# Altium footprint library ICs And Semiconductors THD.PcbLib: 350 footprints (part 19 of 22) (continued)
## TEXAS_EBA (R-PSIP-T12) [mm] "TEXAS EBA (R-PSIP-T12) Case" (continued)
3D body "TEXAS_EBA (R-PSIP-T12).stp": height 9.65, standoff -3.26, extent -21.715,-0.215 21.715,18.02

## TEXAS_ECL (R-PDSS-T10) [mm] "Texas ECL (R-PDSS-T10)  Case"
height 8.5
pads (10):
  round 2.1 hole 1.4: 1(-7.935,6.355) 2(-7.935,1.275) 3(-7.935,-6.345) 4(4.765,-6.345) 5(7.935,-6.345) 6(7.935,-3.805) 7(7.935,-1.265) 8(7.935,1.275) 9(7.935,3.815) 10(7.935,6.355)
Top Overlay:
  lines w0.2: -9.46,-7.875 -9.46,7.875 9.46,7.875 9.46,-7.875 -9.46,-7.875
  text "1" at -6.216,5.852 h1.2
Notvisible:
  lines w0.1: -8.435,-6.345 -7.935,-6.345 ; -8.435,1.275 -7.935,1.275 ; -8.435,6.355 -7.935,6.355 ; -7.935,-6.845 -7.935,-6.345 ; -7.935,-5.845 -7.935,-6.345 ; -7.935,0.775 -7.935,1.275 ; -7.935,1.775 -7.935,1.275 ; -7.935,5.855 -7.935,6.355 ; -7.935,6.855 -7.935,6.355 ; -7.435,-6.345 -7.935,-6.345 ; -7.435,1.275 -7.935,1.275 ; -7.435,6.355 -7.935,6.355 ; -0.5,0 0,0 ; 0,-0.5 0,0 ; 0,0.5 0,0 ; 0.5,0 0,0 ; 4.265,-6.345 4.765,-6.345 ; 4.765,-6.845 4.765,-6.345 ; 4.765,-5.845 4.765,-6.345 ; 5.265,-6.345 4.765,-6.345 ; 7.435,-6.345 7.935,-6.345 ; 7.435,-3.805 7.935,-3.805 ; 7.435,-1.265 7.935,-1.265 ; 7.435,1.275 7.935,1.275 ; 7.435,3.815 7.935,3.815 ; 7.435,6.355 7.935,6.355 ; 7.935,-6.845 7.935,-6.345 ; 7.935,-5.845 7.935,-6.345 ; 7.935,-4.305 7.935,-3.805 ; 7.935,-3.305 7.935,-3.805 ; 7.935,-1.765 7.935,-1.265 ; 7.935,-0.765 7.935,-1.265 ; 7.935,0.775 7.935,1.275 ; 7.935,1.775 7.935,1.275 ; 7.935,3.315 7.935,3.815 ; 7.935,4.315 7.935,3.815 ; 7.935,5.855 7.935,6.355 ; 7.935,6.855 7.935,6.355 ; 8.435,-6.345 7.935,-6.345 ; 8.435,-3.805 7.935,-3.805 ; 8.435,-1.265 7.935,-1.265 ; 8.435,1.275 7.935,1.275 ; 8.435,3.815 7.935,3.815 ; 8.435,6.355 7.935,6.355
Mechanical 14:
  lines w0.1: -9.46,-7.875 -9.46,7.875 9.46,7.875 9.46,-7.875 -9.46,-7.875 ; -4.963,-3.774 -1.963,-3.774 -1.963,-0.774 -4.963,-0.774 -4.963,-3.774 ; -4.963,0.422 -1.963,0.422 -1.963,3.422 -4.963,3.422 -4.963,0.422 ; -4.963,4.361 -1.963,4.361 -1.963,7.361 -4.963,7.361 -4.963,4.361 ; -0.75,2.683 0.75,2.683 0.75,4.683 -0.75,4.683 -0.75,2.683 ; -0.75,5.572 0.75,5.572 0.75,7.072 -0.75,7.072 -0.75,5.572 ; 1.656,-4.966 cw(c3.314,-2.466) 1.656,0.034 4.972,0.034 cw(c3.314,-2.466) 4.972,-4.966 1.656,-4.966 ; 4.255,4.516 5.755,4.516 5.755,6.016 4.255,6.016 4.255,4.516
  text "1" at -6.216,5.852 h1.2
Mechanical 15:
  lines w0.05: -9.97,-8.38 -9.97,8.38 9.97,8.38 9.97,-8.38 -9.97,-8.38
3D body "TEXAS_ECL (R-PDSS-T10).stp": height 8.5, standoff -3.55, extent -9.46,-7.875 9.46,7.875

## TEXAS_EGP (R-PDSS-T12) [mm] "Texas EGP (R-PDSS-T12) Case"
height 9.65
pads (12):
  round 2.1 hole 1.4: 1(-11.11,7.94) 2(-11.11,-7.94) 3(-1.59,-7.94) 4(11.11,-7.94)
  round 1.1 hole 0.7: 5(11.11,-0.95) 6(11.11,0.32) 7(11.11,1.59) 8(11.11,2.86) 9(11.11,4.13) 10(11.11,5.4) 11(11.11,6.67) 11(11.11,7.94)
Top Overlay:
  lines w0.2: -12.635,-9.46 12.635,-9.46 12.635,9.46 -12.635,9.46 -12.635,-9.46
  text "1" at -9.391,7.392 h1.2
Notvisible:
  lines w0.1: -12.11,-7.94 -11.11,-7.94 ; -12.11,7.94 -11.11,7.94 ; -11.11,-8.94 -11.11,-7.94 ; -11.11,-6.94 -11.11,-7.94 ; -11.11,6.94 -11.11,7.94 ; -11.11,8.94 -11.11,7.94 ; -10.11,-7.94 -11.11,-7.94 ; -10.11,7.94 -11.11,7.94 ; -2.59,-7.94 -1.59,-7.94 ; -1.59,-8.94 -1.59,-7.94 ; -1.59,-6.94 -1.59,-7.94 ; -1,0 0,0 ; -0.59,-7.94 -1.59,-7.94 ; 0,-1 0,0 ; 0,1 0,0 ; 1,0 0,0 ; 10.11,-7.94 11.11,-7.94 ; 10.11,-0.95 11.11,-0.95 ; 10.11,0.32 11.11,0.32 12.11,0.32 ; 10.11,1.59 11.11,1.59 12.11,1.59 ; 10.11,2.86 11.11,2.86 12.11,2.86 ; 10.11,4.13 11.11,4.13 12.11,4.13 ; 10.11,5.4 11.11,5.4 12.11,5.4 ; 10.11,6.67 11.11,6.67 12.11,6.67 ; 10.11,7.94 11.11,7.94 ; 11.11,-8.94 11.11,-7.94 ; 11.11,-6.94 11.11,-7.94 ; 12.11,-7.94 11.11,-7.94 ; 12.11,-0.95 11.11,-0.95 ; 12.11,7.94 11.11,7.94 ; 11.11,-0.95 11.11,7.94
Mechanical 14:
  lines w0.1: -11.987,-3.37 -9.287,-3.37 ; -11.987,-0.97 -9.287,-0.97 ; -11.987,1.648 -9.287,1.648 ; -11.987,4.048 -9.287,4.048 ; 1.053,-8.309 1.053,-5.609 ; 3.453,-8.309 3.453,-5.609 ; 5.957,-8.309 5.957,-5.609 ; 8.357,-8.309 8.357,-5.609 ; -12.635,-9.46 12.635,-9.46 12.635,9.46 -12.635,9.46 -12.635,-9.46 ; -11.987,-3.87 -9.287,-3.87 -9.287,-0.47 -11.987,-0.47 -11.987,-3.87 ; -11.987,1.148 -9.287,1.148 -9.287,4.548 -11.987,4.548 -11.987,1.148 ; -8.076,-6.046 -3.076,-6.046 -3.076,-2.046 -8.076,-2.046 -8.076,-6.046 ; -8.076,2.804 -3.076,2.804 -3.076,6.804 -8.076,6.804 -8.076,2.804 ; -1.431,-4.339 -1.431,7.661 8.569,7.661 8.569,-4.339 -1.431,-4.339 ; 0.553,-8.309 3.953,-8.309 3.953,-5.609 0.553,-5.609 0.553,-8.309 ; 5.457,-8.309 8.857,-8.309 8.857,-5.609 5.457,-5.609 5.457,-8.309
  text "1" at -9.391,7.392 h1.2
Mechanical 15:
  lines w0.1: -13.145,-9.97 -13.145,9.97 13.145,9.97 13.145,-9.97 -13.145,-9.97
3D body "TEXAS_EGP (R-PDSS-T12).stp": height 9.65, standoff -3.55, extent -12.635,-9.46 12.635,9.46

## TEXAS_ELA (R-MSIP-T23) [mm] "TEXAS (R-MSIP-T23) Case"
height 12.7
pads (27):
  round 1.7 hole 1.2: 1(27.94,-10.665) 2(25.4,-10.665) 3(22.86,-10.665) 4(20.32,-10.665) 5(17.78,-10.665) 6(15.24,-10.665) 7(12.7,-10.665) 8(10.16,-10.665) 9(7.62,-10.665) 10(5.08,-10.665) 11(2.54,-10.665) 12(0,-10.665) 13(-2.54,-10.665) 14(-5.08,-10.665) 15(-7.62,-10.665) 16(-10.16,-10.665) 17(-12.7,-10.665) 18(-15.24,-10.665) 19(-17.78,-10.665) 20(-20.32,-10.665) 21(-22.86,-10.665) 22(-25.4,-10.665) 23(-27.94,-10.665)
  round 2.3 hole 1.8: 24(-32.105,-10.665) 25(-32.105,10.665) 26(32.105,10.665) 27(32.105,-10.665)
Top Overlay:
  lines w0.2: -32.605,-12.079 -32.605,-19.055 -31.605,-19.055 -31.605,-14.735 31.605,-14.735 31.605,-19.055 32.605,-19.055 32.605,-12.079 ; -32.605,-9.251 -32.605,9.251 ; -30.691,11.165 30.691,11.165 ; 32.605,-9.251 32.605,9.251
  text "1" at 27.684,-9.323 h1.2
Notvisible:
  lines w0.1: -33.105,-10.665 -32.105,-10.665 ; -33.105,10.665 -32.105,10.665 ; -32.105,-11.665 -32.105,-10.665 ; -32.105,-9.665 -32.105,-10.665 ; -32.105,9.665 -32.105,10.665 ; -32.105,11.665 -32.105,10.665 ; -31.105,-10.665 -32.105,-10.665 ; -31.105,10.665 -32.105,10.665 ; -28.94,-10.665 -27.94,-10.665 ; -27.94,-11.665 -27.94,-10.665 ; -27.94,-9.665 -27.94,-10.665 ; -26.94,-10.665 -27.94,-10.665 ; -26.4,-10.665 -25.4,-10.665 ; -25.4,-11.665 -25.4,-10.665 ; -25.4,-9.665 -25.4,-10.665 ; -24.4,-10.665 -25.4,-10.665 ; -23.86,-10.665 -22.86,-10.665 ; -22.86,-11.665 -22.86,-10.665 ; -22.86,-9.665 -22.86,-10.665 ; -21.86,-10.665 -22.86,-10.665 ; -21.32,-10.665 -20.32,-10.665 ; -20.32,-11.665 -20.32,-10.665 ; -20.32,-9.665 -20.32,-10.665 ; -19.32,-10.665 -20.32,-10.665 ; -18.78,-10.665 -17.78,-10.665 ; -17.78,-11.665 -17.78,-10.665 ; -17.78,-9.665 -17.78,-10.665 ; -16.78,-10.665 -17.78,-10.665 ; -16.24,-10.665 -15.24,-10.665 ; -15.24,-11.665 -15.24,-10.665 ; -15.24,-9.665 -15.24,-10.665 ; -14.24,-10.665 -15.24,-10.665 ; -13.7,-10.665 -12.7,-10.665 ; -12.7,-11.665 -12.7,-10.665 ; -12.7,-9.665 -12.7,-10.665 ; -11.7,-10.665 -12.7,-10.665 ; -11.16,-10.665 -10.16,-10.665 ; -10.16,-11.665 -10.16,-10.665 ; -10.16,-9.665 -10.16,-10.665 ; -9.16,-10.665 -10.16,-10.665 ; -8.62,-10.665 -7.62,-10.665 ; -7.62,-11.665 -7.62,-10.665 ; -7.62,-9.665 -7.62,-10.665 ; -6.62,-10.665 -7.62,-10.665 ; -6.08,-10.665 -5.08,-10.665 ; -5.08,-11.665 -5.08,-10.665 ; -5.08,-9.665 -5.08,-10.665 ; -4.08,-10.665 -5.08,-10.665 ; -3.54,-10.665 -2.54,-10.665 ; -2.54,-11.665 -2.54,-10.665 ; -2.54,-9.665 -2.54,-10.665 ; -1.54,-10.665 -2.54,-10.665 ; -1,-10.665 0,-10.665 ; -1,0 0,0 ; 0,-11.665 0,-10.665 ; 0,-9.665 0,-10.665 ; 0,-1 0,0 ; 0,1 0,0 ; 1,-10.665 0,-10.665 ; 1,0 0,0 ; 1.54,-10.665 2.54,-10.665 ; 2.54,-11.665 2.54,-10.665 ; 2.54,-9.665 2.54,-10.665 ; 3.54,-10.665 2.54,-10.665 ; 4.08,-10.665 5.08,-10.665 ; 5.08,-11.665 5.08,-10.665 ; 5.08,-9.665 5.08,-10.665 ; 6.08,-10.665 5.08,-10.665 ; 6.62,-10.665 7.62,-10.665 ; 7.62,-11.665 7.62,-10.665 ; 7.62,-9.665 7.62,-10.665 ; 8.62,-10.665 7.62,-10.665 ; 9.16,-10.665 10.16,-10.665 ; 10.16,-11.665 10.16,-10.665 ; 10.16,-9.665 10.16,-10.665 ; 11.16,-10.665 10.16,-10.665 ; 11.7,-10.665 12.7,-10.665 ; 12.7,-11.665 12.7,-10.665 ; 12.7,-9.665 12.7,-10.665 ; 13.7,-10.665 12.7,-10.665 ; 14.24,-10.665 15.24,-10.665 ; 15.24,-11.665 15.24,-10.665 ; 15.24,-9.665 15.24,-10.665 ; 16.24,-10.665 15.24,-10.665 ; 16.78,-10.665 17.78,-10.665 ; 17.78,-11.665 17.78,-10.665 ; 17.78,-9.665 17.78,-10.665 ; 18.78,-10.665 17.78,-10.665 ; 19.32,-10.665 20.32,-10.665 ; 20.32,-11.665 20.32,-10.665 ; 20.32,-9.665 20.32,-10.665 ; 21.32,-10.665 20.32,-10.665 ; 21.86,-10.665 22.86,-10.665 ; 22.86,-11.665 22.86,-10.665 ; 22.86,-9.665 22.86,-10.665 ; 23.86,-10.665 22.86,-10.665 ; 24.4,-10.665 25.4,-10.665 ; 25.4,-11.665 25.4,-10.665 ; 25.4,-9.665 25.4,-10.665 ; 26.4,-10.665 25.4,-10.665 ; 26.94,-10.665 27.94,-10.665 ; 27.94,-11.665 27.94,-10.665 ; 27.94,-9.665 27.94,-10.665 ; 28.94,-10.665 27.94,-10.665 ; 31.105,-10.665 32.105,-10.665 ; 31.105,10.665 32.105,10.665 ; 32.105,-11.665 32.105,-10.665 ; 32.105,-9.665 32.105,-10.665 ; 32.105,9.665 32.105,10.665 ; 32.105,11.665 32.105,10.665 ; 33.105,-10.665 32.105,-10.665 ; 33.105,10.665 32.105,10.665
Mechanical 14:
  lines w0.1: -29.105,-14.735 -29.105,-12.235 29.105,-12.235 29.105,-14.735 ; -28.44,-14.735 -31.605,-14.735 -31.605,-19.055 -32.605,-19.055 -32.605,11.165 32.605,11.165 32.605,-19.055 31.605,-19.055 31.605,-14.735 28.44,-14.735 ; -27.44,-14.735 -25.9,-14.735 ; -24.9,-14.735 -23.36,-14.735 ; -22.36,-14.735 -20.82,-14.735 ; -19.82,-14.735 -18.28,-14.735 ; -17.28,-14.735 -15.74,-14.735 ; -14.74,-14.735 -13.2,-14.735 ; -12.2,-14.735 -10.66,-14.735 ; -9.66,-14.735 -8.12,-14.735 ; -7.12,-14.735 -5.58,-14.735 ; -4.58,-14.735 -3.04,-14.735 ; -2.04,-14.735 -0.5,-14.735 ; 0.5,-14.735 2.04,-14.735 ; 3.04,-14.735 4.58,-14.735 ; 5.58,-14.735 7.12,-14.735 ; 8.12,-14.735 9.66,-14.735 ; 10.66,-14.735 12.2,-14.735 ; 13.2,-14.735 14.74,-14.735 ; 15.74,-14.735 17.28,-14.735 ; 18.28,-14.735 19.82,-14.735 ; 20.82,-14.735 22.36,-14.735 ; 23.36,-14.735 24.9,-14.735 ; 25.9,-14.735 27.44,-14.735 ; -28.44,-15.535 -27.44,-15.535 -27.44,-13.331 -28.44,-13.331 -28.44,-15.535 ; -25.9,-15.535 -24.9,-15.535 -24.9,-13.331 -25.9,-13.331 -25.9,-15.535 ; -23.36,-15.535 -22.36,-15.535 -22.36,-13.331 -23.36,-13.331 -23.36,-15.535 ; -20.82,-15.535 -19.82,-15.535 -19.82,-13.331 -20.82,-13.331 -20.82,-15.535 ; -18.28,-15.535 -17.28,-15.535 -17.28,-13.331 -18.28,-13.331 -18.28,-15.535 ; -15.74,-15.535 -14.74,-15.535 -14.74,-13.331 -15.74,-13.331 -15.74,-15.535 ; -13.2,-15.535 -12.2,-15.535 -12.2,-13.331 -13.2,-13.331 -13.2,-15.535 ; -10.66,-15.535 -9.66,-15.535 -9.66,-13.331 -10.66,-13.331 -10.66,-15.535 ; -8.12,-15.535 -7.12,-15.535 -7.12,-13.331 -8.12,-13.331 -8.12,-15.535 ; -5.58,-15.535 -4.58,-15.535 -4.58,-13.331 -5.58,-13.331 -5.58,-15.535 ; -3.04,-15.535 -2.04,-15.535 -2.04,-13.331 -3.04,-13.331 -3.04,-15.535 ; -0.5,-15.535 0.5,-15.535 0.5,-13.331 -0.5,-13.331 -0.5,-15.535 ; 2.04,-15.535 3.04,-15.535 3.04,-13.331 2.04,-13.331 2.04,-15.535 ; 4.58,-15.535 5.58,-15.535 5.58,-13.331 4.58,-13.331 4.58,-15.535 ; 7.12,-15.535 8.12,-15.535 8.12,-13.331 7.12,-13.331 7.12,-15.535 ; 9.66,-15.535 10.66,-15.535 10.66,-13.331 9.66,-13.331 9.66,-15.535 ; 12.2,-15.535 13.2,-15.535 13.2,-13.331 12.2,-13.331 12.2,-15.535 ; 14.74,-15.535 15.74,-15.535 15.74,-13.331 14.74,-13.331 14.74,-15.535 ; 17.28,-15.535 18.28,-15.535 18.28,-13.331 17.28,-13.331 17.28,-15.535 ; 19.82,-15.535 20.82,-15.535 20.82,-13.331 19.82,-13.331 19.82,-15.535 ; 22.36,-15.535 23.36,-15.535 23.36,-13.331 22.36,-13.331 22.36,-15.535 ; 24.9,-15.535 25.9,-15.535 25.9,-13.331 24.9,-13.331 24.9,-15.535 ; 27.44,-15.535 28.44,-15.535 28.44,-13.331 27.44,-13.331 27.44,-15.535
  text "1" at 27.684,-9.323 h1.2
3D body "TEXAS_ELA (R-MSIP-T23).stp": height 12.7, standoff -4, extent -32.605,-19.055 32.605,11.165

## TEXAS_ERW (R-PDSS-T11) [mm] "Texas ERW (R-PDSS-T11) Case, Body W 51.94 x L 26.54 x H9.98mm"
height 8.98
pads (11):
  round 2 hole 1.3: 1(-24.445,9.51) 2(-24.445,3.16) 3(-24.445,-3.19) 4(-24.445,-9.54) 5(24.445,-9.54) 6(24.445,-6.365) 7(24.445,-3.19) 8(24.445,-0.015) 9(24.445,3.16) 10(24.445,6.335) 11(24.445,9.51)
Top Overlay:
  circle w0.2: c-24.37,12.085 r0.5
  circle w0.2: c11.97,0.23 r3.35
  circle w0.2: c11.97,0.23 r3.85
  lines w0.2: -22.16,8.861 -22.16,7.67 -21.68,7.67 -21.68,8.87 ; -21.22,11.35 -21.22,11.92 -19.62,11.92 -19.62,11.353 ; -20.66,8.861 -20.66,7.67 -20.18,7.67 -20.18,8.861 ; -19.16,8.87 -19.16,7.67 -18.68,7.67 -18.68,8.87 ; -10.03,-9.57 -14.23,-9.57 -14.23,2.03 -10.03,2.03 ; -0.03,-9.57 4.17,-9.57 4.17,2.03 -0.03,2.03 ; 5.47,6.38 2.564,6.38 2.564,7.27 5.47,7.27 ; 5.47,8.66 4.47,8.66 4.47,9.55 5.47,9.55 ; 5.47,10.94 2.564,10.94 2.564,11.83 5.47,11.83 ; 7.57,-11.83 4.664,-11.83 4.664,-10.94 7.57,-10.94 ; 7.57,-9.55 6.57,-9.55 6.57,-8.66 7.57,-8.66 ; 7.57,-7.27 4.664,-7.27 4.664,-6.38 7.57,-6.38 ; 11.69,6.375 12.46,6.375 12.96,7.175 12.96,11.035 12.46,11.835 11.69,11.835 ; 13.79,-11.835 14.56,-11.835 15.06,-11.035 15.06,-7.175 14.56,-6.375 13.79,-6.375 ; 18.299,-3.559 20.999,-3.559 ; 18.299,-1.159 20.999,-1.159 ; -26.35,-13.65 26.35,-13.65 26.35,13.65 -26.35,13.65 -26.35,-13.65 ; -22.67,-9.77 -17.67,-9.77 -17.67,-3.37 -22.67,-3.37 -22.67,-9.77 ; -22.67,8.87 -18.17,8.87 -18.17,11.35 -22.67,11.35 -22.67,8.87 ; -13.17,6.07 -8.97,6.07 -8.97,9.07 -13.17,9.07 -13.17,6.07 ; -10.03,-11.27 -10.03,3.73 -0.03,3.73 -0.03,-11.27 -10.03,-11.27 ; 5.47,5.74 11.69,5.74 11.69,12.47 5.47,12.47 5.47,5.74 ; 6.72,-3.07 8.52,-4.87 15.42,-4.87 17.22,-3.07 17.22,3.53 ccw(c15.42,3.53) 15.42,5.33 8.52,5.33 6.72,3.53 6.72,-3.07 ; 7.57,-12.47 13.79,-12.47 13.79,-5.74 7.57,-5.74 7.57,-12.47 ; 18.299,-4.059 18.299,-0.659 20.999,-0.659 20.999,-4.059 18.299,-4.059
Notvisible:
  lines w0.1: -24.945,-9.54 -24.445,-9.54 ; -24.945,-3.19 -24.445,-3.19 ; -24.945,3.16 -24.445,3.16 ; -24.945,9.51 -24.445,9.51 ; -24.445,-10.04 -24.445,-9.54 ; -24.445,-9.04 -24.445,-9.54 ; -24.445,-3.69 -24.445,-3.19 ; -24.445,-2.69 -24.445,-3.19 ; -24.445,2.66 -24.445,3.16 ; -24.445,3.66 -24.445,3.16 ; -24.445,9.01 -24.445,9.51 ; -24.445,10.01 -24.445,9.51 ; -23.945,-9.54 -24.445,-9.54 ; -23.945,-3.19 -24.445,-3.19 ; -23.945,3.16 -24.445,3.16 ; -23.945,9.51 -24.445,9.51 ; -0.354,-0.354 0,0 ; -0.354,0.354 0,0 ; 0.354,-0.354 0,0 ; 0.354,0.354 0,0 ; 23.945,-9.54 24.445,-9.54 ; 23.945,-6.365 24.445,-6.365 ; 23.945,-3.19 24.445,-3.19 ; 23.945,-0.015 24.445,-0.015 ; 23.945,3.16 24.445,3.16 ; 23.945,6.335 24.445,6.335 ; 23.945,9.51 24.445,9.51 ; 24.445,-10.04 24.445,-9.54 ; 24.445,-9.04 24.445,-9.54 ; 24.445,-6.865 24.445,-6.365 ; 24.445,-5.865 24.445,-6.365 ; 24.445,-3.69 24.445,-3.19 ; 24.445,-2.69 24.445,-3.19 ; 24.445,-0.515 24.445,-0.015 ; 24.445,0.485 24.445,-0.015 ; 24.445,2.66 24.445,3.16 ; 24.445,3.66 24.445,3.16 ; 24.445,5.835 24.445,6.335 ; 24.445,6.835 24.445,6.335 ; 24.445,9.01 24.445,9.51 ; 24.445,10.01 24.445,9.51 ; 24.945,-9.54 24.445,-9.54 ; 24.945,-6.365 24.445,-6.365 ; 24.945,-3.19 24.445,-3.19 ; 24.945,-0.015 24.445,-0.015 ; 24.945,3.16 24.445,3.16 ; 24.945,6.335 24.445,6.335 ; 24.945,9.51 24.445,9.51
Mechanical 14:
  circle w0.1: c-24.37,12.085 r0.5
  circle w0.1: c11.97,0.23 r3.35
  circle w0.1: c11.97,0.23 r3.85
  circle w0.1: c-24.445,9.51 r0.85
  circle w0.1: c-24.445,3.16 r0.85
  circle w0.1: c-24.445,-3.19 r0.85
  circle w0.1: c-24.445,-9.54 r0.85
  circle w0.1: c24.445,-9.54 r0.85
  circle w0.1: c24.445,-6.365 r0.85
  circle w0.1: c24.445,-3.19 r0.85
  circle w0.1: c24.445,-0.015 r0.85
  circle w0.1: c24.445,3.16 r0.85
  circle w0.1: c24.445,6.335 r0.85
  circle w0.1: c24.445,9.51 r0.85
  lines w0.1: -22.16,8.861 -22.16,7.67 -21.68,7.67 -21.68,8.87 ; -21.22,11.35 -21.22,11.92 -19.62,11.92 -19.62,11.353 ; -20.66,8.861 -20.66,7.67 -20.18,7.67 -20.18,8.861 ; -19.16,8.87 -19.16,7.67 -18.68,7.67 -18.68,8.87 ; -10.03,-9.57 -14.23,-9.57 -14.23,2.03 -10.03,2.03 ; -0.03,-9.57 4.17,-9.57 4.17,2.03 -0.03,2.03 ; 5.47,6.38 2.564,6.38 2.564,7.27 5.47,7.27 ; 5.47,8.66 4.47,8.66 4.47,9.55 5.47,9.55 ; 5.47,10.94 2.564,10.94 2.564,11.83 5.47,11.83 ; 7.57,-11.83 4.664,-11.83 4.664,-10.94 7.57,-10.94 ; 7.57,-9.55 6.57,-9.55 6.57,-8.66 7.57,-8.66 ; 7.57,-7.27 4.664,-7.27 4.664,-6.38 7.57,-6.38 ; 11.69,6.375 12.46,6.375 12.96,7.175 12.96,11.035 12.46,11.835 11.69,11.835 ; 13.79,-11.835 14.56,-11.835 15.06,-11.035 15.06,-7.175 14.56,-6.375 13.79,-6.375 ; 18.299,-3.559 20.999,-3.559 ; 18.299,-1.159 20.999,-1.159 ; -26.35,-13.65 26.35,-13.65 26.35,13.65 -26.35,13.65 -26.35,-13.65 ; -22.67,-9.77 -17.67,-9.77 -17.67,-3.37 -22.67,-3.37 -22.67,-9.77 ; -22.67,8.87 -18.17,8.87 -18.17,11.35 -22.67,11.35 -22.67,8.87 ; -13.17,6.07 -8.97,6.07 -8.97,9.07 -13.17,9.07 -13.17,6.07 ; -10.03,-11.27 -10.03,3.73 -0.03,3.73 -0.03,-11.27 -10.03,-11.27 ; 5.47,5.74 11.69,5.74 11.69,12.47 5.47,12.47 5.47,5.74 ; 6.72,-3.07 8.52,-4.87 15.42,-4.87 17.22,-3.07 17.22,3.53 ccw(c15.42,3.53) 15.42,5.33 8.52,5.33 6.72,3.53 6.72,-3.07 ; 7.57,-12.47 13.79,-12.47 13.79,-5.74 7.57,-5.74 7.57,-12.47 ; 18.299,-4.059 18.299,-0.659 20.999,-0.659 20.999,-4.059 18.299,-4.059
3D body "TEXAS_ERW (R-PDSS-T11).stp": height 9.98, standoff -3.55, extent -26.35,-13.65 26.35,13.65

## TEXAS_EUS (R-PDSS-T5) [mm] "Texas EUS (R-PDSS-T5) Case"
height 8.5
pads (5):
  round 2.1 hole 1.4: 1(-7.94,4.765) 2(-7.94,-1.585) 3(-7.94,-4.765) 4(7.94,-4.765) 5(7.94,4.765)
Top Overlay:
  lines w0.2: -9.46,-6.285 9.46,-6.285 9.46,6.285 -9.46,6.285 -9.46,-6.285
  text "1" at -6.166,4.217 h1.2
Notvisible:
  lines w0.1: -8.94,-4.765 -7.94,-4.765 ; -8.94,-1.585 -7.94,-1.585 ; -8.94,4.765 -7.94,4.765 ; -7.94,-5.765 -7.94,-4.765 ; -7.94,-3.765 -7.94,-4.765 ; -7.94,-2.585 -7.94,-1.585 ; -7.94,-0.585 -7.94,-1.585 ; -7.94,3.765 -7.94,4.765 ; -7.94,5.765 -7.94,4.765 ; -6.94,-4.765 -7.94,-4.765 ; -6.94,-1.585 -7.94,-1.585 ; -6.94,4.765 -7.94,4.765 ; -1,0 0,0 ; 0,-1 0,0 ; 0,1 0,0 ; 1,0 0,0 ; 6.94,-4.765 7.94,-4.765 ; 6.94,4.765 7.94,4.765 ; 7.94,-5.765 7.94,-4.765 ; 7.94,-3.765 7.94,-4.765 ; 7.94,3.765 7.94,4.765 ; 7.94,5.765 7.94,4.765 ; 8.94,-4.765 7.94,-4.765 ; 8.94,4.765 7.94,4.765
Mechanical 14:
  lines w0.1: -9.46,-6.285 -9.46,6.285 9.46,6.285 9.46,-6.285 -9.46,-6.285 ; -8.247,-0.059 -8.247,3.341 -5.547,3.341 -5.547,-0.059 -8.247,-0.059 ; -3.912,-5.523 -3.912,-0.523 0.088,-0.523 0.088,-5.523 -3.912,-5.523 ; -3.912,0.502 -3.912,5.502 0.088,5.502 0.088,0.502 -3.912,0.502 ; 2.154,-3.194 2.154,2.806 8.154,2.806 8.154,-3.194 2.154,-3.194
  text "1" at -6.166,4.217 h1.2
Mechanical 15:
  lines w0.05: -9.97,-6.795 -9.97,6.795 9.97,6.795 9.97,-6.795 -9.97,-6.795
3D body "TEXAS_EUS (R-PDSS-T5).stp": height 8.5, standoff -3.55, extent -9.46,-6.285 9.46,6.285

## TEXAS_EUU (R-PDSS-T6) [mm] "Texas TEXAS_EUU (R-PDSS-T6) Case"
height 8.5
pads (6):
  round 2.1 hole 1.4: 1(-9.53,4.77) 2(-9.53,1.59) 3(-9.53,-1.59) 4(-9.53,-4.77) 5(9.53,-4.75) 6(9.53,4.77)
Top Overlay:
  lines w0.2: -11.05,-6.285 11.05,-6.285 11.05,6.285 -11.05,6.285 -11.05,-6.285
  text "1" at -7.366,4.202 h1.2
Notvisible:
  lines w0.1: -10.53,-4.77 -9.53,-4.77 ; -10.53,-1.59 -9.53,-1.59 ; -10.53,1.59 -9.53,1.59 ; -10.53,4.77 -9.53,4.77 ; -9.53,-5.77 -9.53,-4.77 ; -9.53,-3.77 -9.53,-4.77 ; -9.53,-2.59 -9.53,-1.59 ; -9.53,-0.59 -9.53,-1.59 ; -9.53,0.59 -9.53,1.59 ; -9.53,2.59 -9.53,1.59 ; -9.53,3.77 -9.53,4.77 ; -9.53,5.77 -9.53,4.77 ; -8.53,-4.77 -9.53,-4.77 ; -8.53,-1.59 -9.53,-1.59 ; -8.53,1.59 -9.53,1.59 ; -8.53,4.77 -9.53,4.77 ; -1,0 0,0 ; 0,-1 0,0 ; 0,1 0,0 ; 1,0 0,0 ; 8.53,-4.75 9.53,-4.75 ; 8.53,4.77 9.53,4.77 ; 9.53,-5.75 9.53,-4.75 ; 9.53,-3.75 9.53,-4.75 ; 9.53,3.77 9.53,4.77 ; 9.53,5.77 9.53,4.77 ; 10.53,-4.75 9.53,-4.75 ; 10.53,4.77 9.53,4.77
Mechanical 14:
  lines w0.1: -11.05,-6.285 11.05,-6.285 11.05,6.285 -11.05,6.285 -11.05,-6.285 ; -8.247,-0.77 -8.247,2.63 -5.547,2.63 -5.547,-0.77 -8.247,-0.77 ; -7.867,-5.631 -7.867,-1.631 -2.867,-1.631 -2.867,-5.631 -7.867,-5.631 ; -4.715,-0.254 -4.715,4.746 -0.715,4.746 -0.715,-0.254 -4.715,-0.254 ; 0,-5.285 0,0.715 6,0.715 6,-5.285 0,-5.285 ; 2.45,2.799 5.85,2.799 5.85,5.499 2.45,5.499 2.45,2.799
  text "1" at -7.366,4.202 h1.2
Mechanical 15:
  lines w0.1: -11.56,-6.795 11.56,-6.795 11.56,6.795 -11.56,6.795 -11.56,-6.795
3D body "TEXAS_EUU (R-PDSS-T6).stp": height 8.5, standoff -3.55, extent -11.05,-6.285 11.05,6.285

## TEXAS_LMF (O-MBCY-W8) [mm] "TO-3 8 Pins, Texas LMF (O-MBCY-W8) Case"
height 7.62
pads (10):
  round 2 hole 1.3: 1(-4.864,-4.082) 2(-1.103,-6.254) 3(3.175,-5.499) 4(5.967,-2.172) 5(5.967,2.172) 6(3.175,5.499) 7(-1.103,6.254) 8(-4.864,4.082)
  round 8.2 hole 4.2: 9(-15.075,0) 10(15.075,0)
Top Overlay:
  circle w0.2: c0,0 r9.78
  lines w0.2: -17.627,-3.839 cw(c-15.075,0) -17.627,3.839 -7.171,10.789 cw(c0,0) 7.171,10.789 17.627,3.839 cw(c15.075,0) 17.627,-3.839 7.171,-10.789 cw(c0,0) -7.171,-10.789 -17.627,-3.839
Notvisible:
  lines w0.1: -15.575,0 -15.075,0 ; -15.075,-0.5 -15.075,0 ; -15.075,0.5 -15.075,0 ; -14.575,0 -15.075,0 ; -5.247,-4.403 -4.864,-4.082 ; -5.247,4.403 -4.864,4.082 ; -5.186,-3.699 -4.864,-4.082 ; -5.186,3.699 -4.864,4.082 ; -4.543,-4.465 -4.864,-4.082 ; -4.543,4.465 -4.864,4.082 ; -4.481,-3.76 -4.864,-4.082 ; -4.481,3.76 -4.864,4.082 ; -1.595,-6.167 -1.103,-6.254 ; -1.595,6.167 -1.103,6.254 ; -1.189,-6.746 -1.103,-6.254 ; -1.189,6.746 -1.103,6.254 ; -1.016,-5.761 -1.103,-6.254 ; -1.016,5.761 -1.103,6.254 ; -0.61,-6.34 -1.103,-6.254 ; -0.61,6.34 -1.103,6.254 ; -0.5,0 0,0 ; 0,-0.5 0,0 ; 0,0.5 0,0 ; 0.5,0 0,0 ; 2.742,-5.749 3.175,-5.499 ; 2.742,5.749 3.175,5.499 ; 2.925,-5.066 3.175,-5.499 ; 2.925,5.066 3.175,5.499 ; 3.425,-5.932 3.175,-5.499 ; 3.425,5.932 3.175,5.499 ; 3.608,-5.249 3.175,-5.499 ; 3.608,5.249 3.175,5.499 ; 5.497,-2.001 5.967,-2.172 ; 5.497,2.001 5.967,2.172 ; 5.796,-2.642 5.967,-2.172 ; 5.796,2.642 5.967,2.172 ; 6.138,-1.702 5.967,-2.172 ; 6.138,1.702 5.967,2.172 ; 6.437,-2.343 5.967,-2.172 ; 6.437,2.343 5.967,2.172 ; 14.575,0 15.075,0 ; 15.075,-0.5 15.075,0 ; 15.075,0.5 15.075,0 ; 15.575,0 15.075,0
Mechanical 14:
  circle w0.1: c0,0 r9.78
  circle w0.1: c15.075,0 r1.95
  circle w0.1: c-15.075,0 r1.95
  lines w0.1: -17.627,-3.839 cw(c-15.075,0) -17.627,3.839 -7.171,10.789 cw(c0,0) 7.171,10.789 17.627,3.839 cw(c15.075,0) 17.627,-3.839 7.171,-10.789 cw(c0,0) -7.171,-10.789 -17.627,-3.839
3D body "TEXAS_LMF (O–MBCY–W8).stp": height 7.62, standoff -6, extent -19.639,-12.955 19.64,12.955

## TGS 2620 [mm] "4 Leads Solvent Vapors Sensor, Body Dia. 9.2mm, Body Height 7.8mm, Lead Spacing Diameter 5.1mm"
height 8.3
pads (4):
  round 2 hole 1.3: 1(-1.8,1.806) 2(-1.8,-1.806) 3(1.8,-1.806) 4(1.8,1.806)
Top Overlay:
  circle w0.2: c0,0 r4.7
  lines w0.2: -0.25,4.693 -0.25,5.2 0.25,5.2 0.25,4.693
Notvisible:
  lines w0.1: -2.3,-1.806 -1.8,-1.806 ; -2.3,1.806 -1.8,1.806 ; -1.8,-2.306 -1.8,-1.806 ; -1.8,-1.306 -1.8,-1.806 ; -1.8,1.306 -1.8,1.806 ; -1.8,2.306 -1.8,1.806 ; -1.3,-1.806 -1.8,-1.806 ; -1.3,1.806 -1.8,1.806 ; -0.5,0 0,0 ; 0,-0.5 0,0 ; 0,0.5 0,0 ; 0.5,0 0,0 ; 1.3,-1.806 1.8,-1.806 ; 1.3,1.806 1.8,1.806 ; 1.8,-2.306 1.8,-1.806 ; 1.8,-1.306 1.8,-1.806 ; 1.8,1.306 1.8,1.806 ; 1.8,2.306 1.8,1.806 ; 2.3,-1.806 1.8,-1.806 ; 2.3,1.806 1.8,1.806
Mechanical 14:
  circle w0.1: c0,0 r2
  circle w0.1: c0,0 r4.7
  lines w0.1: -0.25,4.693 -0.25,5.2 0.25,5.2 0.25,4.693
3D body "TGS 2620.stp": height 9.3, standoff -3.6, extent -4.7,-4.694 4.7,5.2

## TO-5-4 [mm] "TO-5, 4 Leads"
height 11.25
pads (4):
  round 1.5 hole 0.8: 1(0,2.54) 2(-2.54,0) 3(0,-2.54) 4(2.54,0)
Top Overlay:
  circle w0.2: c0,0 r4.25
  lines w0.2: 2.99,3.626 ccw(c0,0) 3.626,2.99 4.278,3.642 3.642,4.278 2.99,3.626
Notvisible:
  lines w0.1: -3.04,0 -2.54,0 ; -2.54,-0.5 -2.54,0 ; -2.54,0.5 -2.54,0 ; -2.04,0 -2.54,0 ; -0.5,-2.54 0,-2.54 ; -0.5,0 0,0 ; -0.5,2.54 0,2.54 ; 0,-3.04 0,-2.54 ; 0,-2.04 0,-2.54 ; 0,-0.5 0,0 ; 0,0.5 0,0 ; 0,2.04 0,2.54 ; 0,3.04 0,2.54 ; 0.5,-2.54 0,-2.54 ; 0.5,0 0,0 ; 0.5,2.54 0,2.54
Mechanical 14:
  circle w0.1: c0,0 r4.25
  lines w0.1: 2.99,3.626 ccw(c0,0) 3.626,2.99 4.278,3.642 3.642,4.278 2.99,3.626
3D body "TO-5-3.stp": height 11.25, standoff -3.65, extent -4.7,-4.7 4.7,4.7

## TO-18 [mm] "TO-18  3 Leads, Pitch 2.54mm, Body Dia. 5.84mm, Leads Dia. 0.5mm"
height 10.13
pads (3):
  round 1.4 hole 0.8: 1(0,1.27) 2(-1.27,0) 3(0,-1.27)
Top Overlay:
  circle w0.2: c0,0 r2.47
  lines w0.2: 1.593,2.447 ccw(c0,0) 2.447,1.593 3.282,2.428 2.428,3.282 1.593,2.447
Mechanical 14:
  circle w0.1: c0,0 r2.47
  lines w0.1: 1.593,2.447 ccw(c0,0) 2.447,1.593 3.282,2.428 2.428,3.282 1.593,2.447
3D body "TO-18.stp": height 10.13, standoff -3.6, extent -2.92,-2.92 3.282,3.282